# Altium footprint library PCB_IntegratedCircuit.PcbLib: 56 footprints (part 1 of 4)
Each footprint in its own frame and in the unit in brackets; x right, y up, seen from the top. Pads: shape width x height; smd on the part's side, far side on the other; paste and mask are expansions set on the pad; w line width, h text height; cw(c..) or ccw(c..) is an arc to the next point about the centre after c.
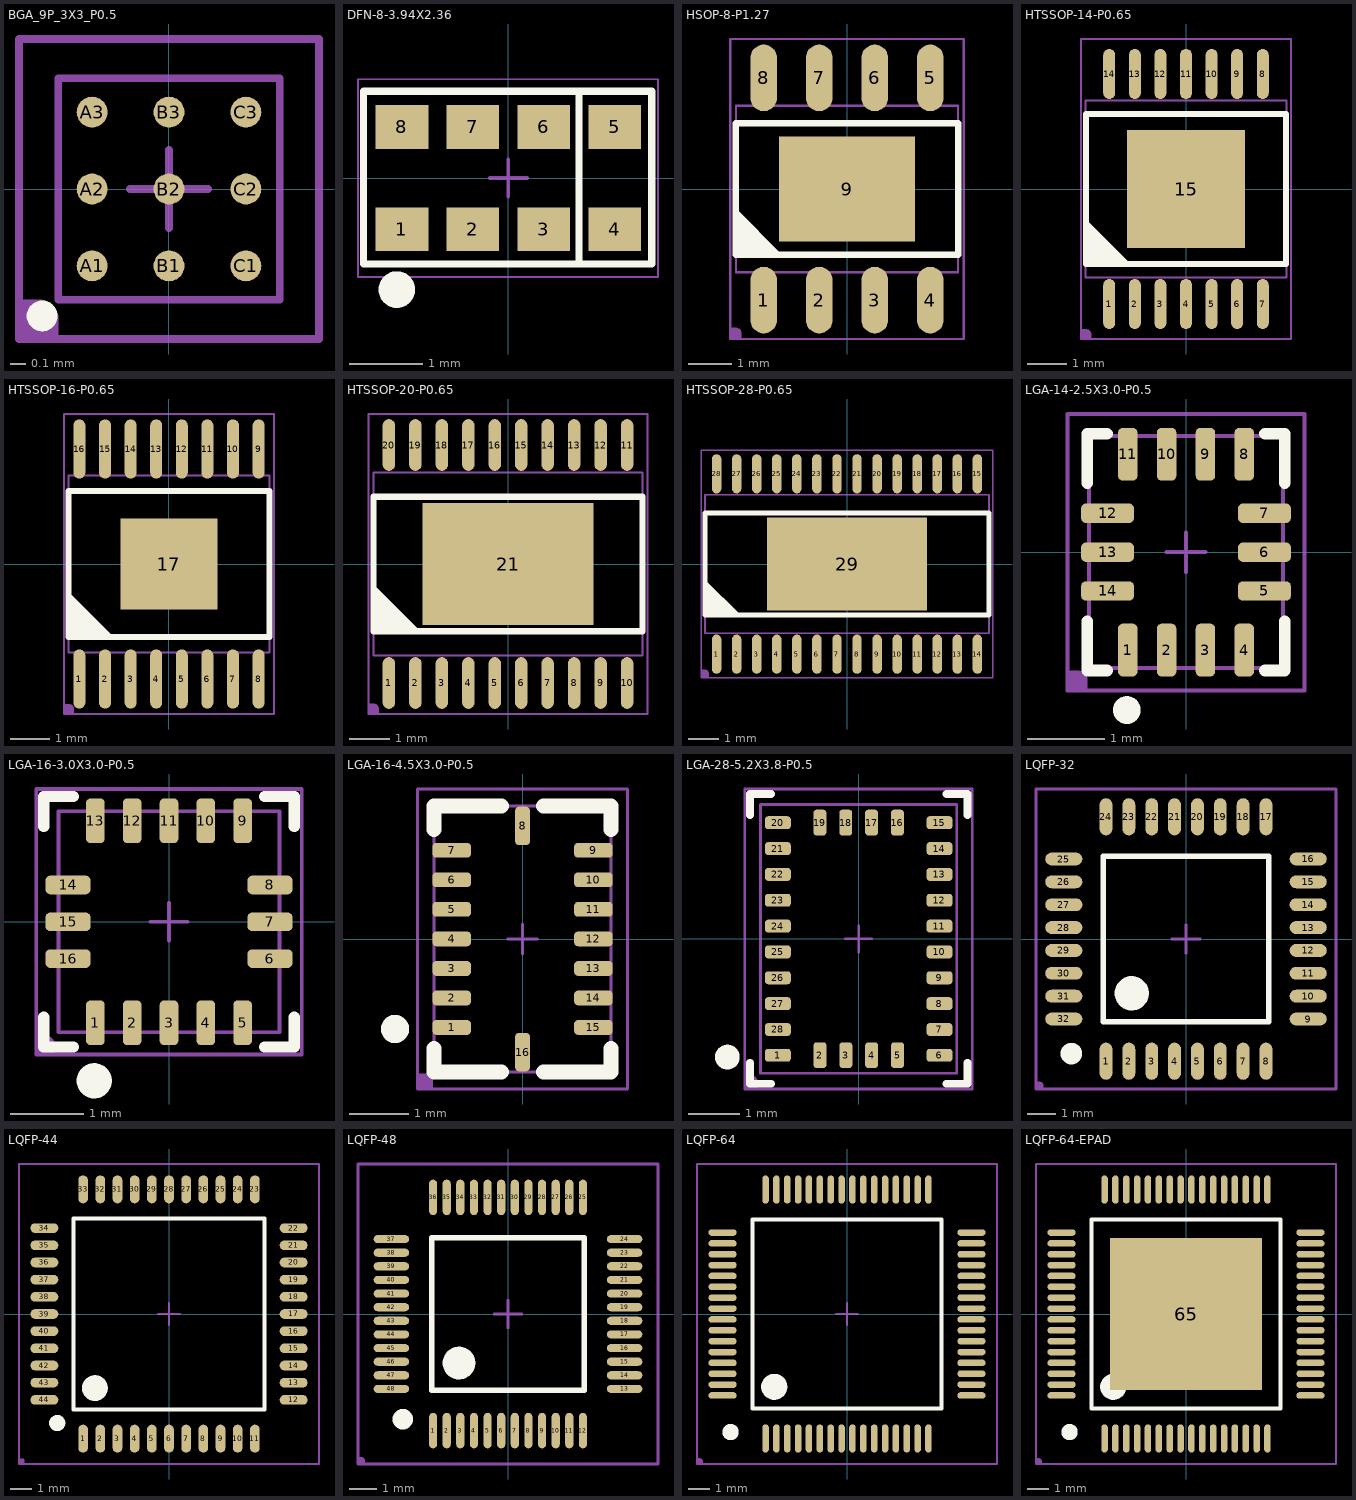
[diagram p0: the footprints below, top view; thin cyan lines are the x and y axes]

## BGA_9P_3X3_P0.5 [mm] "BGA, 9-Leads, Body 1.44x1.44mmx0.63mm, Pitch 0.50mm"
height 0.63
pads (9):
  round 0.2 smd: A1(-0.5,-0.5) A2(-0.5,0) A3(-0.5,0.5) B1(0,-0.5) B2(0,0) B3(0,0.5) C1(0.5,-0.5) C2(0.5,0) C3(0.5,0.5)
Top Overlay:
  circle w0.1: c-0.825,-0.825 r0.05
Top Assembly (Mech13):
  lines w0.051: -0.254,0 0.254,0 ; 0,-0.254 0,0.254 ; -0.72,-0.72 -0.72,0.72 0.72,0.72 0.72,-0.72 -0.72,-0.72
Top Component:
  region: -0.975,-0.975 -0.975,-0.721 -0.848,-0.721 -0.823,-0.721 -0.776,-0.74 -0.74,-0.776 -0.721,-0.823 -0.721,-0.848 -0.721,-0.975
  lines w0.05: -0.975,-0.975 -0.975,0.975 0.975,0.975 0.975,-0.975 -0.975,-0.975
  text ".Designator" at -0.406,-0.279 h1
3D body: height 0.63, standoff 0.35, extent -0.72,-0.72 0.72,0.72

## DFN-8-3.94X2.36 [mm]
pads (8):
  rect 0.72x0.6 smd mask+0.025: 1(-1.455,-0.7) 2(-0.485,-0.7) 3(0.485,-0.7) 4(1.455,-0.7) 5(1.455,0.7) 6(0.485,0.7) 7(-0.485,0.7) 8(-1.455,0.7)
Top Overlay:
  circle w0.25: c-1.524,-1.524 r0.125
  lines w0.1: 0.965,-1.143 0.965,1.168 ; -1.979,-1.174 1.961,-1.174 1.961,1.186 -1.979,1.186 -1.979,-1.174
Top Assembly (Mech13):
  lines w0.051: -0.254,0 0.254,0 ; 0,-0.254 0,0.254 ; -1.979,-1.174 -1.979,1.186 1.961,1.186 1.961,-1.174 -1.979,-1.174
Top Component:
  text ".Designator" at -1.041,-0.61 h2.54
Mechanical 20:
  lines w0.025: -2.055,-1.35 -2.055,1.35 2.045,1.35 2.045,-1.35 -2.055,-1.35
3D body: height 1.35, standoff 0, extent -1.979,-1.174 1.961,1.186

## HSOP-8-P1.27 [mil]
pads (9):
  oval 24x60 smd: 1(-75,-100) 2(-25,-100) 3(25,-100) 4(75,-100) 5(75,100) 6(25,100) 7(-25,100) 8(-75,100)
  rect 122.05x94.49 smd: 9(0,0)
Top Overlay:
  region: -99.41,-58.07 -99.41,-18.07 -59.41,-58.07
  lines w6: -100,-59.06 -100,59.06 100,59.06 100,-59.06 -100,-59.06
Top Assembly (Mech13):
  lines w2.01: -10,0 10,0 ; 0,-10 0,10 ; -100,-75 100,-75 100,75 -100,75 -100,-75
Top Component:
  region: -105,-135 -105,-125 -100,-125 -99.01,-125 -97.17,-125.76 -95.76,-127.17 -95,-129.01 -95,-130 -95,-135
  lines w2: -105,-135 105,-135 105,135 -105,135 -105,-135
  text ".Designator" at -41,-20 h80
3D body "SOIC_8_PAD.STEP": height 71.06, standoff -0.13, extent -98.43,-118.08 98.42,118.08

## HTSSOP-14-P0.65 [mil]
height 47.24
pads (15):
  oval 12x50 smd: 1(-76.77,-115) 2(-51.18,-115) 3(-25.59,-115) 4(0,-115) 5(25.59,-115) 6(51.18,-115) 7(76.77,-115) 8(76.77,115) 9(51.18,115) 10(25.59,115) 11(0,115) 12(-25.59,115) 13(-51.18,115) 14(-76.77,115)
  rect 118.11x118.11 smd: 15(0,0)
Top Overlay:
  region: -100.47,-75 -100.47,-30 -55.47,-75
  lines w6: -100,-75 -100,75 100,75 100,-75 -100,-75
Top Assembly (Mech13):
  lines w2.01: -10,0 10,0 ; 0,-10 0,10 ; -100.39,-88.58 -100.39,88.58 100.39,88.58 100.39,-88.58 -100.39,-88.58
Top Component:
  region: -105,-150 -105,-140 -100,-140 -99.01,-140 -97.17,-140.76 -95.76,-142.17 -95,-144.01 -95,-145 -95,-150
  lines w2: -105,-150 -105,150 105,150 105,-150 -105,-150
  text ".Designator" at -41,-20 h80
3D body "User Library-tssop14-2.STEP": height 47.24, standoff 0, extent -100.4,-125.98 100.39,125.99

## HTSSOP-16-P0.65 [mm]
height 1.2
pads (17):
  oval 0.305x1.5 smd: 1(-2.275,-2.921) 2(-1.625,-2.921) 3(-0.975,-2.921) 4(-0.325,-2.921) 5(0.325,-2.921) 6(0.975,-2.921) 7(1.625,-2.921) 8(2.275,-2.921) 9(2.275,2.921) 10(1.625,2.921) 11(0.975,2.921) 12(0.325,2.921) 13(-0.325,2.921) 14(-0.975,2.921) 15(-1.625,2.921) 16(-2.275,2.921)
  rect 2.46x2.31 smd: 17(0,0)
Top Overlay:
  region: -2.562,-1.85 -2.562,-0.707 -1.419,-1.85
  lines w0.152: -2.55,-1.85 2.55,-1.85 2.55,1.85 -2.55,1.85 -2.55,-1.85
Top Assembly (Mech13):
  lines w0.051: -0.254,0 0.254,0 ; 0,-0.254 0,0.254 ; -2.55,-2.25 2.55,-2.25 2.55,2.25 -2.55,2.25 -2.55,-2.25
Top Component:
  region: -2.667,-3.81 -2.667,-3.556 -2.54,-3.556 -2.515,-3.556 -2.468,-3.575 -2.432,-3.611 -2.413,-3.658 -2.413,-3.683 -2.413,-3.81
  lines w0.051: -2.667,-3.81 -2.667,3.81 2.667,3.81 2.667,-3.81 -2.667,-3.81
  text ".Designator" at -1.041,-0.508 h2.03
3D body "User Library-tssop16-2.STEP": height 1.2, standoff 0, extent -2.55,-3.2 2.55,3.2

## HTSSOP-20-P0.65 [mil]
height 47.24
pads (21):
  oval 12x50 smd: 1(-115.16,-115) 2(-89.57,-115) 3(-63.98,-115) 4(-38.39,-115) 5(-12.8,-115) 6(12.8,-115) 7(38.39,-115) 8(63.98,-115) 9(89.57,-115) 10(115.16,-115) 11(115.16,115) 12(89.57,115) 13(63.98,115) 14(38.39,115) 15(12.8,115) 16(-12.8,115) 17(-38.39,115) 18(-63.98,115) 19(-89.57,115) 20(-115.16,115)
  rect 165.35x118.11 smd: 21(0,0)
Top Overlay:
  region: -130,-65 -130,-20 -85,-65
  lines w6: -130,-65 -130,65 130,65 130,-65 -130,-65
Top Assembly (Mech13):
  lines w2.01: -10,0 10,0 ; 0,-10 0,10 ; -129.92,-88.58 -129.92,88.58 129.92,88.58 129.92,-88.58 -129.92,-88.58
Top Component:
  region: -135,-145 -135,-135 -130,-135 -129.01,-135 -127.17,-135.76 -125.76,-137.17 -125,-139.01 -125,-140 -125,-145
  lines w2: -135,-145 135,-145 135,145 -135,145 -135,-145
  text ".Designator" at -41,-20 h80
3D body "User Library-TSSOP-20 6_6x4_4.STEP": height 41.69, standoff -1.62, extent -129.93,-125.98 129.91,125.99

## HTSSOP-28-P0.65 [mil]
height 47.24
pads (29):
  oval 12x50 smd: 1(-166.34,-115) 2(-140.75,-115) 3(-115.16,-115) 4(-89.57,-115) 5(-63.98,-115) 6(-38.39,-115) 7(-12.8,-115) 8(12.8,-115) 9(38.39,-115) 10(63.98,-115) 11(89.57,-115) 12(115.16,-115) 13(140.75,-115) 14(166.34,-115) 15(166.34,115) 16(140.75,115) 17(115.16,115) 18(89.57,115) 19(63.98,115) 20(38.39,115) 21(12.8,115) 22(-12.8,115) 23(-38.39,115) 24(-63.98,115) 25(-89.57,115) 26(-115.16,115) 27(-140.75,115) 28(-166.34,115)
  rect 203.94x118.11 smd: 29(0,0)
Top Overlay:
  region: -181.18,-65 -181.18,-20 -136.18,-65
  lines w6: -181.18,-65 181.18,-65 181.18,65 -181.18,65 -181.18,-65
Top Assembly (Mech13):
  lines w2.01: -10,0 10,0 ; 0,-10 0,10 ; -181.1,-88.58 181.1,-88.58 181.1,88.58 -181.1,88.58 -181.1,-88.58
Top Component:
  region: -186.18,-145 -186.18,-135 -181.18,-135 -180.19,-135 -178.35,-135.76 -176.94,-137.17 -176.18,-139.01 -176.18,-140 -176.18,-145
  lines w2: -186.18,-145 186.18,-145 186.18,145 -186.18,145 -186.18,-145
  text ".Designator" at -41,-20 h80
3D body "User Library-TSSOP-20 6_6x4_4.STEP": height 41.69, standoff -1.62, extent -181.1,-125.98 78.74,125.98
3D body "User Library-TSSOP-20 6_6x4_4.STEP": height 41.69, standoff -1.62, extent -78.74,-125.98 181.1,125.98

## LGA-14-2.5X3.0-P0.5 [mm]
pads (14):
  rrect50% 0.25x0.68 smd: 1(-0.75,-1.26) 2(-0.25,-1.26) 3(0.25,-1.26) 4(0.75,-1.26) 8(0.75,1.26) 9(0.25,1.26) 10(-0.25,1.26) 11(-0.75,1.26)
  rrect50% 0.68x0.25 smd: 5(1.01,-0.5) 6(1.01,0) 7(1.01,0.5) 12(-1.01,0.5) 13(-1.01,0) 14(-1.01,-0.5)
Top Overlay:
  circle w0.254: c-0.762,-2.032 r0.051
  lines w0.152: -1.27,-0.889 -1.27,-1.524 -1.016,-1.524 ; -1.27,0.889 -1.27,1.524 -1.016,1.524 ; 1.016,-1.524 1.27,-1.524 1.27,-0.889 ; 1.016,1.524 1.27,1.524 1.27,0.889
Top Assembly (Mech13):
  lines w0.051: -0.254,0 0.254,0 ; 0,-0.254 0,0.254 ; -1.25,-1.492 -1.25,1.492 1.25,1.492 1.25,-1.492 -1.25,-1.492
Top Component:
  region: -1.524,-1.778 -1.524,-1.524 -1.397,-1.524 -1.372,-1.524 -1.325,-1.543 -1.289,-1.579 -1.27,-1.626 -1.27,-1.651 -1.27,-1.778
  lines w0.051: -1.524,-1.778 -1.524,1.778 1.524,1.778 1.524,-1.778 -1.524,-1.778
  text ".Designator" at -1.041,-0.508 h2.03
3D body: height 0.83, standoff 0, extent -1.25,-1.492 1.25,1.492

## LGA-16-3.0X3.0-P0.5 [mil]
height 29.53
pads (16):
  rrect50% 10x24 smd: 1(-39.37,-54) 2(-19.68,-54) 3(0,-54) 4(19.68,-54) 5(39.37,-54) 9(39.37,54) 10(19.68,54) 11(0,54) 12(-19.68,54) 13(-39.37,54)
  rrect50% 24x10 smd: 6(54,-19.68) 7(54,0) 8(54,19.68) 14(-54,19.68) 15(-54,0) 16(-54,-19.68)
Top Overlay:
  circle w10: c-40,-85 r4.4
  lines w6: -67,-51 -67,-67 -51,-67 ; -67,51 -67,67 -51,67 ; 51,-67 67,-67 67,-51 ; 51,67 67,67 67,51
Top Assembly (Mech13):
  lines w2: -10,0 10,0 ; 0,-10 0,10 ; -59.06,-59.06 -59.06,59.06 59.06,59.06 59.06,-59.06 -59.06,-59.06
Top Component:
  region: -71,-71 -71,-61 -66,-61 -65.01,-61 -63.17,-61.76 -61.76,-63.17 -61,-65.01 -61,-66 -61,-71
  lines w2: -71,-71 -71,71 71,71 71,-71 -71,-71
  text ".Designator" at -41,-20 h80
3D body "PQFN50P300X300X75-16L.step": height 29.53, standoff 0, extent -59.06,-59.06 59.06,59.06

## LGA-16-4.5X3.0-P0.5 [mm]
pads (16):
  rrect50% 0.65x0.25 smd: 1(-1.2,-1.498) 2(-1.2,-0.998) 3(-1.2,-0.498) 4(-1.2,0.002) 5(-1.2,0.502) 6(-1.2,1.002) 7(-1.2,1.502) 9(1.2,1.502) 10(1.2,1.002) 11(1.2,0.502) 12(1.2,0.002) 13(1.2,-0.498) 14(1.2,-0.998) 15(1.2,-1.498)
  rrect50% 0.25x0.65 smd: 8(0,1.915) 16(0,-1.915)
Top Overlay:
  circle w0.254: c-2.159,-1.524 r0.112
  lines w0.254: -1.5,-1.854 -1.5,-2.25 -0.356,-2.25 ; -1.5,1.858 -1.5,2.25 -0.356,2.25 ; 0.356,-2.25 1.5,-2.25 1.5,-1.854 ; 0.356,2.25 1.5,2.25 1.5,1.858
Top Assembly (Mech13):
  lines w0.051: -0.254,0 0.254,0 ; 0,-0.254 0,0.254 ; -1.5,-2.25 -1.5,2.25 1.5,2.25 1.5,-2.25 -1.5,-2.25
Top Component:
  region: -1.778,-2.54 -1.778,-2.286 -1.651,-2.286 -1.626,-2.286 -1.579,-2.305 -1.543,-2.341 -1.524,-2.388 -1.524,-2.413 -1.524,-2.54
  lines w0.051: -1.778,-2.54 1.778,-2.54 1.778,2.54 -1.778,2.54 -1.778,-2.54
  text ".Designator" at -1.041,-0.508 h2.03
3D body: height 0.95, standoff 0, extent -1.5,-2.25 1.5,2.25

## LGA-28-5.2X3.8-P0.5 [mm]
height 0.75
pads (28):
  rrect50% 0.5x0.25 smd: 1(-1.563,-2.25) 6(1.563,-2.25) 7(1.563,-1.752) 8(1.563,-1.252) 9(1.563,-0.752) 10(1.563,-0.252) 11(1.563,0.248) 12(1.563,0.748) 13(1.563,1.248) 14(1.563,1.748) 15(1.563,2.248) 20(-1.563,2.248) 21(-1.563,1.748) 22(-1.563,1.248) 23(-1.563,0.748) 24(-1.563,0.248) 25(-1.563,-0.252) 26(-1.563,-0.752) 27(-1.563,-1.252) 28(-1.563,-1.752)
  rrect50% 0.25x0.5 smd: 2(-0.749,-2.25) 3(-0.248,-2.25) 4(0.251,-2.25) 5(0.752,-2.25) 16(0.75,2.25) 17(0.25,2.25) 18(-0.25,2.25) 19(-0.75,2.25)
Top Overlay:
  circle w0.254: c-2.54,-2.286 r0.112
  lines w0.152: -2.102,2.395 -2.102,2.802 -1.695,2.802 ; 1.695,-2.802 2.102,-2.802 2.102,-2.395 ; 1.695,2.802 2.102,2.802 2.102,2.395 ; -2.102,-2.802 -2.102,-2.395 -2.102,-2.802 ; -2.102,-2.802 -1.695,-2.802 -2.102,-2.802
Top Assembly (Mech13):
  lines w0.051: -0.254,0 0.254,0 ; 0,-0.254 0,0.254 ; -1.9,-2.6 1.9,-2.6 1.9,2.6 -1.9,2.6 -1.9,-2.6
Top Component:
  region: -2.203,-2.903 -2.203,-2.649 -2.076,-2.649 -2.051,-2.649 -2.004,-2.669 -1.969,-2.704 -1.949,-2.751 -1.949,-2.776 -1.949,-2.903
  lines w0.051: -2.203,-2.903 2.2,-2.903 2.2,2.9 -2.203,2.9 -2.203,-2.903
  text ".Designator" at -1.041,-0.508 h2.03
3D body: height 1.18, standoff 0, extent -1.9,-2.6 1.9,2.6

## LQFP-32 [mm]
height 1.2
pads (32):
  oval 0.45x1.3 smd: 1(-2.8,-4.277) 2(-2,-4.277) 3(-1.2,-4.277) 4(-0.4,-4.277) 5(0.4,-4.277) 6(1.2,-4.277) 7(2,-4.277) 8(2.8,-4.277) 17(2.8,4.277) 18(2,4.277) 19(1.2,4.277) 20(0.4,4.277) 21(-0.4,4.277) 22(-1.2,4.277) 23(-2,4.277) 24(-2.8,4.277)
  oval 1.3x0.45 smd: 9(4.277,-2.8) 10(4.277,-2) 11(4.277,-1.2) 12(4.277,-0.4) 13(4.277,0.4) 14(4.277,1.2) 15(4.277,2) 16(4.277,2.8) 25(-4.277,2.8) 26(-4.277,2) 27(-4.277,1.2) 28(-4.277,0.4) 29(-4.277,-0.4) 30(-4.277,-1.2) 31(-4.277,-2) 32(-4.277,-2.8)
Top Overlay:
  circle w0.6: c-1.9,-1.9 r0.3
  circle w0.5: c-4.013,-4.011 r0.125
  lines w0.2: -2.9,-2.9 -2.9,2.9 2.9,2.9 2.9,-2.9 -2.9,-2.9
Top Assembly (Mech13):
  lines w0.1: -0.5,0 0.5,0 ; 0,-0.5 0,0.5
Top Component:
  region: -5.25,-5.25 -5.25,-4.996 -5.123,-4.996 -5.098,-4.996 -5.051,-5.015 -5.015,-5.051 -4.996,-5.098 -4.996,-5.123 -4.996,-5.25
  lines w0.1: -5.25,-5.25 -5.25,5.25 5.25,5.25 5.25,-5.25 -5.25,-5.25
  text ".Designator" at -1.041,-0.61 h2.54
3D body "LQFP_32.STEP": height 1.48, standoff -0.01, extent -4.552,-4.503 4.553,4.503

## LQFP-44 [mm]
height 1.6
pads (44):
  oval 0.45x1.3 smd: 1(-4,-5.804) 2(-3.2,-5.804) 3(-2.4,-5.804) 4(-1.6,-5.804) 5(-0.8,-5.804) 6(0,-5.804) 7(0.8,-5.804) 8(1.6,-5.804) 9(2.4,-5.804) 10(3.2,-5.804) 11(4,-5.804) 23(4,5.804) 24(3.2,5.804) 25(2.4,5.804) 26(1.6,5.804) 27(0.8,5.804) 28(0,5.804) 29(-0.8,5.804) 30(-1.6,5.804) 31(-2.4,5.804) 32(-3.2,5.804) 33(-4,5.804)
  oval 1.3x0.45 smd: 12(5.804,-4) 13(5.804,-3.2) 14(5.804,-2.4) 15(5.804,-1.6) 16(5.804,-0.8) 17(5.804,0) 18(5.804,0.8) 19(5.804,1.6) 20(5.804,2.4) 21(5.804,3.2) 22(5.804,4) 34(-5.804,4) 35(-5.804,3.2) 36(-5.804,2.4) 37(-5.804,1.6) 38(-5.804,0.8) 39(-5.804,0) 40(-5.804,-0.8) 41(-5.804,-1.6) 42(-5.804,-2.4) 43(-5.804,-3.2) 44(-5.804,-4)
Top Overlay:
  circle w0.5: c-5.205,-5.08 r0.125
  circle w0.6: c-3.45,-3.45 r0.3
  lines w0.2: -4.45,-4.45 4.45,-4.45 4.45,4.45 -4.45,4.45 -4.45,-4.45
Top Assembly (Mech13):
  lines w0.1: -0.5,0 0.5,0 ; 0,-0.5 0,0.5
Top Component:
  region: -6.985,-6.985 -6.985,-6.731 -6.858,-6.731 -6.833,-6.731 -6.786,-6.75 -6.75,-6.786 -6.731,-6.833 -6.731,-6.858 -6.731,-6.985
  lines w0.1: -6.985,-6.985 6.985,-6.985 6.985,6.985 -6.985,6.985 -6.985,-6.985
  text ".Designator" at -1.041,-0.61 h2.54
3D body "LQFP_44.STEP": height 1.68, standoff -0.01, extent -5.999,-5.999 5.999,5.999

## LQFP-48 [mm]
height 1.6
pads (48):
  oval 0.3x1.3 smd: 1(-2.75,-4.28) 2(-2.25,-4.28) 3(-1.75,-4.28) 4(-1.25,-4.28) 5(-0.75,-4.28) 6(-0.25,-4.28) 7(0.25,-4.28) 8(0.75,-4.28) 9(1.25,-4.28) 10(1.75,-4.28) 11(2.25,-4.28) 12(2.75,-4.28) 25(2.75,4.28) 26(2.25,4.28) 27(1.75,4.28) 28(1.25,4.28) 29(0.75,4.28) 30(0.25,4.28) 31(-0.25,4.28) 32(-0.75,4.28) 33(-1.25,4.28) 34(-1.75,4.28) 35(-2.25,4.28) 36(-2.75,4.28)
  oval 1.3x0.3 smd: 13(4.28,-2.75) 14(4.28,-2.25) 15(4.28,-1.75) 16(4.28,-1.25) 17(4.28,-0.75) 18(4.28,-0.25) 19(4.28,0.25) 20(4.28,0.75) 21(4.28,1.25) 22(4.28,1.75) 23(4.28,2.25) 24(4.28,2.75) 37(-4.28,2.75) 38(-4.28,2.25) 39(-4.28,1.75) 40(-4.28,1.25) 41(-4.28,0.75) 42(-4.28,0.25) 43(-4.28,-0.25) 44(-4.28,-0.75) 45(-4.28,-1.25) 46(-4.28,-1.75) 47(-4.28,-2.25) 48(-4.28,-2.75)
Top Overlay:
  circle w0.6: c-1.8,-1.8 r0.3
  circle w0.5: c-3.859,-3.861 r0.125
  lines w0.2: -2.8,-2.8 -2.8,2.8 2.8,2.8 2.8,-2.8 -2.8,-2.8
Top Assembly (Mech13):
  lines w0.1: -0.5,0 0.5,0 ; 0,-0.5 0,0.5
Top Component:
  region: -5.505,-5.505 -5.505,-5.251 -5.378,-5.251 -5.353,-5.251 -5.306,-5.27 -5.27,-5.306 -5.251,-5.353 -5.251,-5.378 -5.251,-5.505
  lines w0.1: -5.505,-5.505 -5.505,5.505 5.505,5.505 5.505,-5.505 -5.505,-5.505
  text ".Designator" at -1.041,-0.61 h2.54
3D body "LQFP_48.STEP": height 1.52, standoff -0.01, extent -4.499,-4.499 4.499,4.499

## LQFP-64 [mm]
height 1.6
pads (64):
  oval 0.3x1.3 smd: 1(-3.75,-5.729) 2(-3.25,-5.729) 3(-2.75,-5.729) 4(-2.25,-5.729) 5(-1.75,-5.729) 6(-1.25,-5.729) 7(-0.75,-5.729) 8(-0.25,-5.729) 9(0.25,-5.729) 10(0.75,-5.729) 11(1.25,-5.729) 12(1.75,-5.729) 13(2.25,-5.729) 14(2.75,-5.729) 15(3.25,-5.729) 16(3.75,-5.729) 33(3.75,5.729) 34(3.25,5.729) 35(2.75,5.729) 36(2.25,5.729) 37(1.75,5.729) 38(1.25,5.729) 39(0.75,5.729) 40(0.25,5.729) 41(-0.25,5.729) 42(-0.75,5.729) 43(-1.25,5.729) 44(-1.75,5.729) 45(-2.25,5.729) 46(-2.75,5.729) 47(-3.25,5.729) 48(-3.75,5.729)
  oval 1.3x0.3 smd: 17(5.729,-3.75) 18(5.729,-3.25) 19(5.729,-2.75) 20(5.729,-2.25) 21(5.729,-1.75) 22(5.729,-1.25) 23(5.729,-0.75) 24(5.729,-0.25) 25(5.729,0.25) 26(5.729,0.75) 27(5.729,1.25) 28(5.729,1.75) 29(5.729,2.25) 30(5.729,2.75) 31(5.729,3.25) 32(5.729,3.75) 49(-5.729,3.75) 50(-5.729,3.25) 51(-5.729,2.75) 52(-5.729,2.25) 53(-5.729,1.75) 54(-5.729,1.25) 55(-5.729,0.75) 56(-5.729,0.25) 57(-5.729,-0.25) 58(-5.729,-0.75) 59(-5.729,-1.25) 60(-5.729,-1.75) 61(-5.729,-2.25) 62(-5.729,-2.75) 63(-5.729,-3.25) 64(-5.729,-3.75)
Top Overlay:
  circle w0.5: c-5.357,-5.436 r0.125
  circle w0.6: c-3.35,-3.35 r0.3
  lines w0.2: -4.35,-4.35 4.35,-4.35 4.35,4.35 -4.35,4.35 -4.35,-4.35
Top Assembly (Mech13):
  lines w0.1: -0.5,0 0.5,0 ; 0,-0.5 0,0.5
Top Component:
  region: -6.904,-6.904 -6.904,-6.65 -6.777,-6.65 -6.752,-6.65 -6.705,-6.669 -6.669,-6.705 -6.65,-6.752 -6.65,-6.777 -6.65,-6.904
  lines w0.1: -6.904,-6.904 -6.904,6.904 6.904,6.904 6.904,-6.904 -6.904,-6.904
  text ".Designator" at -1.041,-0.61 h2.54
3D body "LQFP_64.STEP": height 1.78, standoff -0.01, extent -5.999,-5.999 5.999,5.999

## LQFP-64-EPAD [mm]
height 1.6
pads (65):
  oval 0.3x1.3 smd: 1(-3.75,-5.729) 2(-3.25,-5.729) 3(-2.75,-5.729) 4(-2.25,-5.729) 5(-1.75,-5.729) 6(-1.25,-5.729) 7(-0.75,-5.729) 8(-0.25,-5.729) 9(0.25,-5.729) 10(0.75,-5.729) 11(1.25,-5.729) 12(1.75,-5.729) 13(2.25,-5.729) 14(2.75,-5.729) 15(3.25,-5.729) 16(3.75,-5.729) 33(3.75,5.729) 34(3.25,5.729) 35(2.75,5.729) 36(2.25,5.729) 37(1.75,5.729) 38(1.25,5.729) 39(0.75,5.729) 40(0.25,5.729) 41(-0.25,5.729) 42(-0.75,5.729) 43(-1.25,5.729) 44(-1.75,5.729) 45(-2.25,5.729) 46(-2.75,5.729) 47(-3.25,5.729) 48(-3.75,5.729)
  oval 1.3x0.3 smd: 17(5.729,-3.75) 18(5.729,-3.25) 19(5.729,-2.75) 20(5.729,-2.25) 21(5.729,-1.75) 22(5.729,-1.25) 23(5.729,-0.75) 24(5.729,-0.25) 25(5.729,0.25) 26(5.729,0.75) 27(5.729,1.25) 28(5.729,1.75) 29(5.729,2.25) 30(5.729,2.75) 31(5.729,3.25) 32(5.729,3.75) 49(-5.729,3.75) 50(-5.729,3.25) 51(-5.729,2.75) 52(-5.729,2.25) 53(-5.729,1.75) 54(-5.729,1.25) 55(-5.729,0.75) 56(-5.729,0.25) 57(-5.729,-0.25) 58(-5.729,-0.75) 59(-5.729,-1.25) 60(-5.729,-1.75) 61(-5.729,-2.25) 62(-5.729,-2.75) 63(-5.729,-3.25) 64(-5.729,-3.75)
  rect 7x7 smd: 65(0,0)
Top Overlay:
  circle w0.6: c-3.35,-3.35 r0.3
  circle w0.5: c-5.357,-5.436 r0.125
  lines w0.2: -4.35,-4.35 -4.35,4.35 4.35,4.35 4.35,-4.35 -4.35,-4.35
Top Assembly (Mech13):
  lines w0.1: -0.5,0 0.5,0 ; 0,-0.5 0,0.5
Top Component:
  region: -6.904,-6.904 -6.904,-6.65 -6.777,-6.65 -6.752,-6.65 -6.705,-6.669 -6.669,-6.705 -6.65,-6.752 -6.65,-6.777 -6.65,-6.904
  lines w0.1: -6.904,-6.904 6.904,-6.904 6.904,6.904 -6.904,6.904 -6.904,-6.904
  text ".Designator" at -1.041,-0.61 h2.54
3D body "LQFP_64.STEP": height 1.78, standoff -0.01, extent -5.999,-5.999 5.999,5.999